# Altium footprint library 3D封装库.PcbLib: 716 footprints (part 41 of 45)
Each footprint in its own frame and in the unit in brackets; x right, y up, seen from the top. Pads: shape width x height; smd on the part's side, far side on the other; paste and mask are expansions set on the pad; w line width, h text height; cw(c..) or ccw(c..) is an arc to the next point about the centre after c.
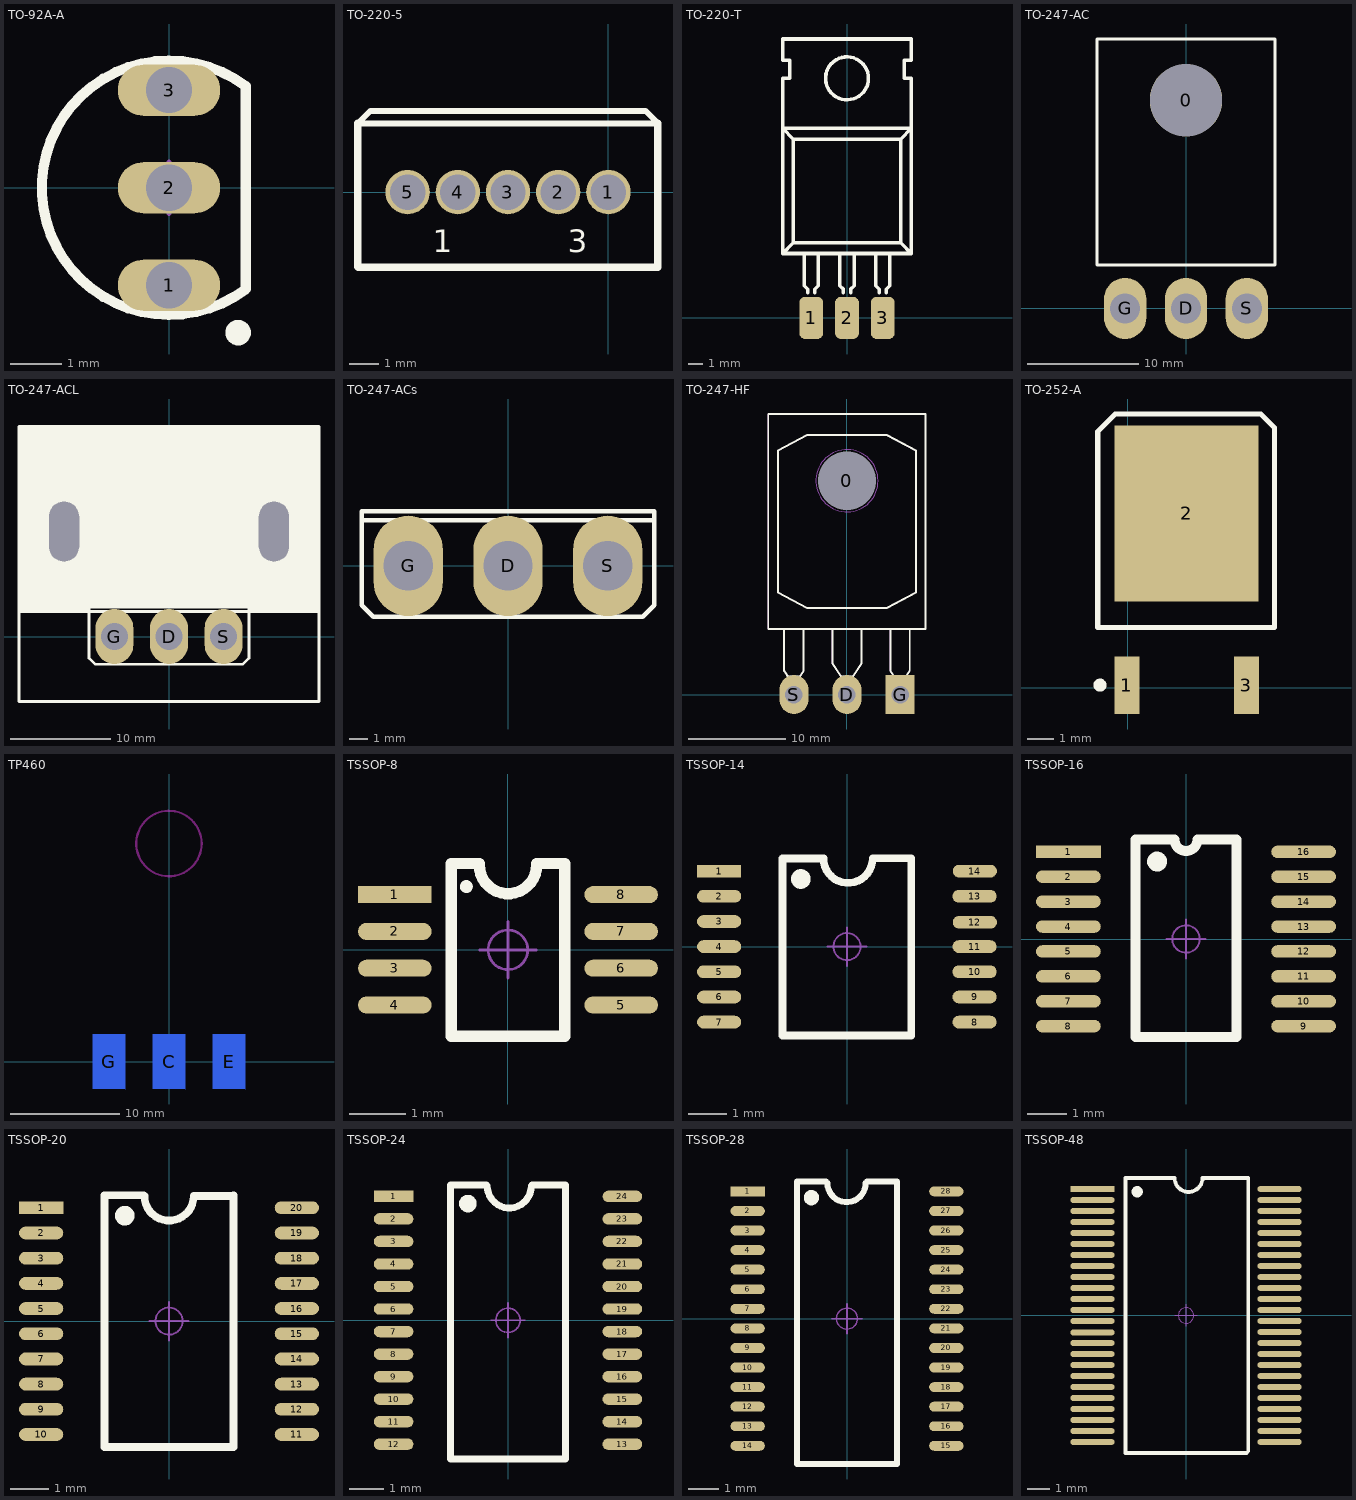
[diagram p40: the footprints below, top view; thin cyan lines are the x and y axes]

## TO-92A-A [mm] "TO, Flat Index; 3 In-Line, Axial Leads; Body Dia. 4.5mm; Leads 0.51 x 0.48 mm (max)"
height 6.86
pads (3):
  oval 2x1 hole 0.9: 1(0,-1.905) 2(0,0) 3(0,1.905)
Top Overlay:
  circle w0.25: c1.35,-2.83 r0.125
  lines w0.2: 1.5,-1.98 cw(c0,0) 1.5,1.98 1.5,-1.98
Mechanical 13:
  lines w0.1: 1.5,-1.98 cw(c0,0) 1.5,1.98 1.5,-1.98
Mechanical 15:
  lines w0.1: -0.5,0 0.5,0 ; 0,-0.5 0,0.5
3D body: height 6.86, standoff 2.2, extent -2.485,-2.495 1.501,2.495

## TO-220-5 [mm]
pads (5):
  round 1.5 hole 1.2: 1(0,0) 2(-1.7,0) 3(-3.4,0) 4(-5.1,0) 5(-6.8,0)
Top Overlay:
  lines w0.2: -8.48,2.328 1.68,2.328 1.257,2.752 -8.057,2.752 -8.48,2.328
  lines w0.254: -8.48,2.328 -8.48,-2.529 -8.469,-2.54 1.669,-2.54 1.68,-2.529 1.68,2.328
  text "3" at -1.368,-2.032 h0.76
  text "1" at -5.94,-2.032 h0.76

## TO-220-T [mm]
pads (3):
  rrect50% 1.7x3 smd: 1(-2.54,0) 2(0,0) 3(2.54,0)
Top Overlay:
  circle w0.254: c0,17.018 r1.524
  lines w0.254: -3.048,4.572 -3.048,2.286 -2.794,2.032 -2.794,1.778 ; -2.286,1.778 -2.286,2.032 -2.032,2.286 -2.032,4.572 ; -0.508,4.572 -0.508,2.286 -0.254,2.032 -0.254,1.778 ; 0.254,1.778 0.254,2.032 0.508,2.286 0.508,4.572 ; 2.032,4.572 2.032,2.286 2.286,2.032 2.286,1.778 ; 2.794,1.778 2.794,2.032 3.048,2.286 3.048,4.572 ; -4.572,4.572 -3.81,5.334 ; -4.572,4.572 -4.572,17.018 -4.064,17.018 -4.064,18.288 -4.572,18.288 -4.572,19.812 4.572,19.812 4.572,18.288 4.064,18.288 4.064,17.78 4.064,17.018 4.572,17.018 4.572,4.572 ; -4.572,4.572 4.572,4.572 ; -3.81,5.334 -3.81,12.7 ; -3.81,5.334 3.81,5.334 ; -3.81,12.7 -4.572,13.462 4.572,13.462 3.81,12.7 ; -3.81,12.7 3.81,12.7 ; 3.81,5.334 4.572,4.572 ; 3.81,5.334 3.81,12.7

## TO-247-AC [mm]
pads (4):
  round 6.5 hole 6.5: 0(0,18.7)
  oval 3.8x5.5 hole 2.7: D(0,0) G(-5.461,0) S(5.461,0)
Top Overlay:
  lines w0.254: -8,3.9 -8,24.2 8,24.2 8,3.9 -8,3.9

## TO-247-ACL [mm]
pads (5):
  rrect50% 0x0 hole 3 slot 6 at 90 deg: 0(-10.5,10.5) 0(10.5,10.5)
  oval 3.8x5.5 hole 2.7: D(0,0) G(-5.461,0) S(5.461,0)
Top Overlay:
  rectangle: 7.874,2.5 15,3.556
  rectangle: -15,2.5 -7.874,3.81
  rectangle: -15,2.794 15,21
  lines w0.254: -15,2.5 0,2.5 15,2.5 ; -8,2.5 -8,-2.16 -7.366,-2.794 5.334,-2.794 7.366,-2.794 8,-2.16 8,2.5 ; -15,-6.5 15,-6.5 15,21 -15,21 -15,-6.5

## TO-247-ACs [mm]
pads (3):
  oval 3.8x5.5 hole 2.7: D(0,0) G(-5.461,0) S(5.461,0)
Top Overlay:
  lines w0.254: -8,2.5 0,2.5 8,2.5 ; -8,2.5 -8,-2.16 -7.366,-2.794 5.334,-2.794 7.366,-2.794 8,-2.16 8,2.5 ; -8,2.5 -8,3 8,3 8,2.5

## TO-247-HF [mm]
pads (4):
  round 5.75 hole 6: 0(0,22)
  oval 3x4 hole 1.8: D(0,0) S(-5.46,0)
  rect 3x4 hole 1.8: G(5.46,0)
Top Overlay:
  lines w0.2: -6.46,6.76 -6.46,2.44 -6.06,1.84 ; -6.06,1.429 -6.06,1.84 ; -4.86,1.429 -4.86,1.84 ; -4.46,6.76 -4.46,2.44 -4.86,1.84 ; -1.5,6.76 -1.5,3.19 -0.6,1.84 ; -0.6,1.429 -0.6,1.84 ; 0.6,1.429 0.6,1.84 ; 1.5,6.76 1.5,3.19 0.6,1.84 ; 4.46,6.76 4.46,2.44 4.86,1.84 ; 4.86,1.429 4.86,1.84 ; 6.06,1.429 6.06,1.84 ; 6.46,6.76 6.46,2.44 6.06,1.84 ; 8.1,28.869 8.1,6.76 -8.1,6.76 -8.1,28.86 8.103,28.869 ; -6.06,1.84 -4.86,1.84 ; -0.6,1.84 0.6,1.84 ; 4.86,1.84 6.06,1.84 ; -7.1,10.51 -7.1,25.11 -4.1,26.7 4.1,26.7 7.1,25.11 7.1,10.51 4.1,8.92 -4.1,8.92 -7.1,10.51
Mechanical 8:
  lines w0.1: -5.46,0 -6.46,0 -5.46,0 ; -5.46,0 -4.46,0 -5.46,0 ; -5.46,0 -5.46,-1 -5.46,0 ; -5.46,0 -5.46,1 -5.46,0 ; 0,0 -1,0 0,0 ; 0,0 1,0 0,0 ; 0,0 0,-1 0,0 ; 0,0 0,1 0,0 ; 0,22 -1,22 0,22 ; 0,22 1,22 0,22 ; 0,22 0,21 0,22 ; 0,22 0,23 0,22 ; 5.46,0 4.46,0 5.46,0 ; 5.46,0 6.46,0 5.46,0 ; 5.46,0 5.46,-1 5.46,0 ; 5.46,0 5.46,1 5.46,0
Mechanical 14:
  circle w0.1: c0,22 r3.202
  lines w0.1: -6.46,6.76 -6.46,2.44 -6.06,1.84 ; -4.46,6.76 -4.46,2.44 -4.86,1.84 ; -1.5,6.76 -1.5,3.19 -0.6,1.84 ; 1.5,6.76 1.5,3.19 0.6,1.84 ; 4.46,6.76 4.46,2.44 4.86,1.84 ; 6.46,6.76 6.46,2.44 6.06,1.84 ; 8.1,28.869 8.1,6.76 -8.1,6.76 -8.1,28.86 8.103,28.869 ; -6.06,1.84 -4.86,1.84 ; -6.06,1.84 -6.06,-0.5 -4.86,-0.5 -4.86,1.84 ; -0.6,1.84 0.6,1.84 ; -0.6,1.84 -0.6,-0.5 0.6,-0.5 0.6,1.84 ; 4.86,1.84 6.06,1.84 ; 4.86,1.84 4.86,-0.5 6.06,-0.5 6.06,1.84 ; -7.1,10.51 -4.1,8.92 4.1,8.92 7.1,10.51 7.1,25.11 4.1,26.7 -4.1,26.7 -7.1,25.11 -7.1,10.51
3D body "TO-247-HFLIP.stp": height 5.2, standoff -3.8, extent -8.1,-0.5 8.1,28.86

## TO-252-A [mm]
pads (3):
  rect 0.95x2.2 smd: 1(-0.03,0.108) 3(4.53,0.108)
  rect 5.5x6.7 smd: 2(2.25,6.658)
Top Overlay:
  circle w0.25: c-1.055,0.108 r0.125
  lines w0.1: -1.1,2.308 5.6,2.308
  lines w0.2: -1.141,2.308 -1.141,9.786 -0.475,10.452 5.075,10.452 5.6,9.926 5.6,2.308 -1.141,2.308
3D body "D-PAK.STEP": height 2.31, standoff 0, extent -1.05,0.033 5.55,9.283

## TP460 [mm]
pads (3):
  rect 3x5 smd far side: C(0,0) E(5.512,0) G(-5.512,0)
Bottom Overlay:
  lines w0.2: -6,5 -6,2.5 -5,2.5 -5,5 ; -0.5,5 -0.5,2.5 0.5,2.5 0.5,5 ; 5,5 5,2.5 6,2.5 6,5
  lines w0.254: -7.493,5 -7.493,25 7.493,25 7.493,5 -7.493,5
Keep-Out Layer:
  circle w0.2: c0,20 r3

## TSSOP-8 [mm] "3.00×4.00×1.00 e=0.65mm（蒜米工坊）"
pads (8):
  rect 1.3x0.3 smd: 1(-2,0.975)
  oval 1.3x0.3 smd: 2(-2,0.325) 3(-2,-0.325) 4(-2,-0.975) 5(2,-0.975) 6(2,-0.325) 7(2,0.325) 8(2,0.975)
Top Overlay:
  circle w0.127: c-0.737,1.118 r0.051
  lines w0.2: -0.508,1.5 ccw(c0,1.5) 0.508,1.5 ; -0.508,1.524 -1,1.524 -1,-1.524 1,-1.524 1,1.524 0.508,1.524
Mechanical 15:
  circle w0.05: c0,0 r0.35
  lines w0.05: -0.5,0 0.5,0 ; 0,-0.5 0,0.5
3D body "TSSOP8.STEP": height 1.03, standoff -0.02, extent -2.052,-1.5 2.052,1.5

## TSSOP-14 [mm] "4.96x4.40x1.00 e=0.65（蒜米工坊）"
pads (14):
  rect 1.143x0.33 smd: 1(-3.304,1.95)
  oval 1.143x0.33 smd: 2(-3.304,1.3) 3(-3.304,0.65) 4(-3.304,0) 5(-3.304,-0.65) 6(-3.304,-1.3) 7(-3.304,-1.95) 8(3.296,-1.95) 9(3.296,-1.3) 10(3.296,-0.65) 11(3.296,0) 12(3.304,0.629) 13(3.296,1.3) 14(3.304,1.95)
Top Overlay:
  circle w0.254: c-1.192,1.747 r0.127
  lines w0.2: -0.617,2.275 -1.669,2.275 -1.669,-2.299 1.661,-2.299 1.661,2.275 ; -0.608,2.28 ccw(c0.027,2.28) 0.662,2.28 1.656,2.28
Mechanical 15:
  circle w0.05: c0,0 r0.35
  lines w0.05: -0.5,0 0.5,0 ; 0,-0.5 0,0.5
3D body "TSSOP14.STEP": height 1.03, standoff -0.02, extent -3.276,-2.48 3.128,2.52

## TSSOP-16 [mil] "4.96x4.40x1.00 e=0.65（蒜米工坊）"
pads (16):
  rect 65x12.5 smd: 1(-118,87.5)
  oval 65x12.5 smd: 2(-118,62.5) 3(-118,37.5) 4(-118,12.5) 5(-118,-12.5) 6(-118,-37.5) 7(-118,-62.5) 8(-118,-87.5) 9(118,-87.5) 10(118,-62.5) 11(118,-37.5) 12(118,-12.5) 13(118,12.5) 14(118,37.5) 15(118,62.5) 16(118,87.5)
Top Overlay:
  lines w10: -29,72.71 cw(c-29,77.71) -28.29,72.76 ; -50.5,-98.5 -50.5,100 -11.54,100 ccw(c0,100) 11.54,100 50.5,100 50.5,-98.5 -50.5,-98.5
Mechanical 15:
  circle w1.97: c0,0 r13.78
  lines w1.97: -19.68,0 19.68,0 ; 0,-19.68 0,19.68
3D body "TSSOP16.STEP": height 40.55, standoff -0.76, extent -124.06,-99.92 128.08,96.93

## TSSOP-20 [mm] "6.50x4.40x1.00 e=0.65（蒜米工坊）"
pads (20):
  rect 1.143x0.33 smd: 1(-3.3,2.925)
  oval 1.143x0.33 smd: 2(-3.3,2.275) 3(-3.3,1.625) 4(-3.3,0.975) 5(-3.3,0.325) 6(-3.3,-0.325) 7(-3.3,-0.975) 8(-3.3,-1.625) 9(-3.3,-2.275) 10(-3.3,-2.925) 11(3.3,-2.925) 12(3.3,-2.275) 13(3.3,-1.625) 14(3.3,-0.975) 15(3.3,-0.325) 16(3.3,0.325) 17(3.3,0.975) 18(3.3,1.625) 19(3.3,2.275) 20(3.3,2.925)
Top Overlay:
  circle w0.254: c-1.141,2.722 r0.127
  lines w0.2: -0.653,3.25 -1.665,3.25 -1.665,-3.25 1.665,-3.25 1.665,3.25 ; -0.633,3.23 ccw(c0.002,3.23) 0.637,3.23 1.645,3.23
Mechanical 15:
  circle w0.05: c0,0 r0.35
  lines w0.05: -0.5,0 0.5,0 ; 0,-0.5 0,0.5
3D body "TSSOP20.STEP": height 1.03, standoff -0.02, extent -3.2,-3.195 3.204,3.305

## TSSOP-24 [mm] "7.80x4.40x1.00 e=0.65（蒜米工坊）"
pads (24):
  rect 1.143x0.33 smd: 1(-3.3,3.575)
  oval 1.143x0.33 smd: 2(-3.3,2.925) 3(-3.3,2.275) 4(-3.3,1.625) 5(-3.3,0.975) 6(-3.3,0.325) 7(-3.3,-0.325) 8(-3.3,-0.975) 9(-3.3,-1.625) 10(-3.3,-2.275) 11(-3.3,-2.925) 12(-3.3,-3.575) 13(3.3,-3.575) 14(3.3,-2.925) 15(3.3,-2.275) 16(3.3,-1.625) 17(3.3,-0.975) 18(3.3,-0.325) 19(3.3,0.325) 20(3.3,0.975) 21(3.3,1.625) 22(3.3,2.275) 23(3.3,2.925) 24(3.3,3.575)
Top Overlay:
  circle w0.254: c-1.157,3.367 r0.127
  lines w0.2: -0.624,3.9 -1.665,3.9 -1.665,-3.999 1.665,-3.999 1.665,3.9 0.697,3.9 ; -0.598,3.875 ccw(c0.037,3.875) 0.672,3.875
Mechanical 15:
  circle w0.05: c0,0 r0.35
  lines w0.05: -0.5,0 0.5,0 ; 0,-0.5 0,0.5
3D body "TSSOP24.STEP": height 1.03, standoff -0.02, extent -3.216,-3.835 3.188,3.965

## TSSOP-28 [mm] "9.70x4.40x1.00 e=0.65（蒜米工坊）"
pads (28):
  rect 1.143x0.33 smd: 1(-3.3,4.225)
  oval 1.143x0.33 smd: 2(-3.3,3.575) 3(-3.3,2.925) 4(-3.3,2.275) 5(-3.3,1.625) 6(-3.3,0.975) 7(-3.3,0.325) 8(-3.3,-0.325) 9(-3.3,-0.975) 10(-3.3,-1.625) 11(-3.3,-2.275) 12(-3.3,-2.925) 13(-3.3,-3.575) 14(-3.3,-4.225) 15(3.3,-4.225) 16(3.3,-3.575) 17(3.3,-2.925) 18(3.3,-2.275) 19(3.3,-1.625) 20(3.3,-0.975) 21(3.3,-0.325) 22(3.3,0.325) 23(3.3,0.975) 24(3.3,1.625) 25(3.3,2.275) 26(3.3,2.925) 27(3.3,3.575) 28(3.3,4.225)
Top Overlay:
  circle w0.254: c-1.182,4.017 r0.127
  lines w0.2: -0.7,4.55 -1.665,4.55 -1.665,-4.829 1.665,-4.829 1.665,4.55 0.672,4.55 ; -0.649,4.499 ccw(c-0.014,4.499) 0.621,4.499
Mechanical 15:
  circle w0.05: c0,0 r0.35
  lines w0.05: -0.5,0 0.5,0 ; 0,-0.5 0,0.5
3D body "TSSOP28.STEP": height 1.03, standoff -0.02, extent -3.292,-4.871 3.112,4.929

## TSSOP-48 [mm] "12.50×6.10×0.95 e=0.50（蒜米工坊）"
pads (48):
  rect 2x0.279 smd: 1(-4.25,5.75)
  oval 2x0.279 smd: 2(-4.25,5.25) 3(-4.25,4.75) 4(-4.25,4.25) 5(-4.25,3.75) 6(-4.25,3.25) 7(-4.25,2.75) 8(-4.25,2.25) 9(-4.25,1.75) 10(-4.25,1.25) 11(-4.25,0.75) 12(-4.25,0.25) 13(-4.25,-0.25) 14(-4.25,-0.77) 15(-4.25,-1.25) 16(-4.25,-1.75) 17(-4.25,-2.25) 18(-4.25,-2.75) 19(-4.25,-3.25) 20(-4.25,-3.75) 21(-4.25,-4.25) 22(-4.25,-4.75) 23(-4.25,-5.25) 24(-4.25,-5.75) 25(4.25,-5.75) 26(4.25,-5.25) 27(4.25,-4.75) 28(4.25,-4.25) 29(4.25,-3.75) 30(4.25,-3.25) 31(4.25,-2.75) 32(4.25,-2.25) 33(4.25,-1.75) 34(4.25,-1.25) 35(4.25,-0.75) 36(4.25,-0.25) 37(4.25,0.25) 38(4.25,0.75) 39(4.25,1.25) 40(4.25,1.75) 41(4.25,2.25) 42(4.25,2.75) 43(4.25,3.25) 44(4.25,3.75) 45(4.25,4.25) 46(4.25,4.75) 47(4.25,5.25) 48(4.25,5.75)
Top Overlay:
  circle w0.254: c-2.218,5.623 r0.127
  lines w0.178: 2.75,-6.25 2.831,-6.169 ; 2.75,-6.25 -2.75,-6.25 -2.75,6.25 -0.52,6.25 ccw(c0.115,6.25) 0.75,6.25 2.831,6.25 2.831,-6.169 ; 2.75,-6.25 2.831,-6.169
Mechanical 15:
  circle w0.05: c0,0 r0.35
  lines w0.05: -0.5,0 0.5,0 ; 0,-0.5 0,0.5
3D body "TSSOP48.STEP": height 1.1, standoff 0.02, extent -4.159,-6.215 4.041,6.285